# Altium footprint library PcbLib1.PcbLib: 10 footprints
Each footprint in its own frame and in the unit in brackets; x right, y up, seen from the top. Pads: shape width x height; smd on the part's side, far side on the other; paste and mask are expansions set on the pad; w line width, h text height; cw(c..) or ccw(c..) is an arc to the next point about the centre after c.
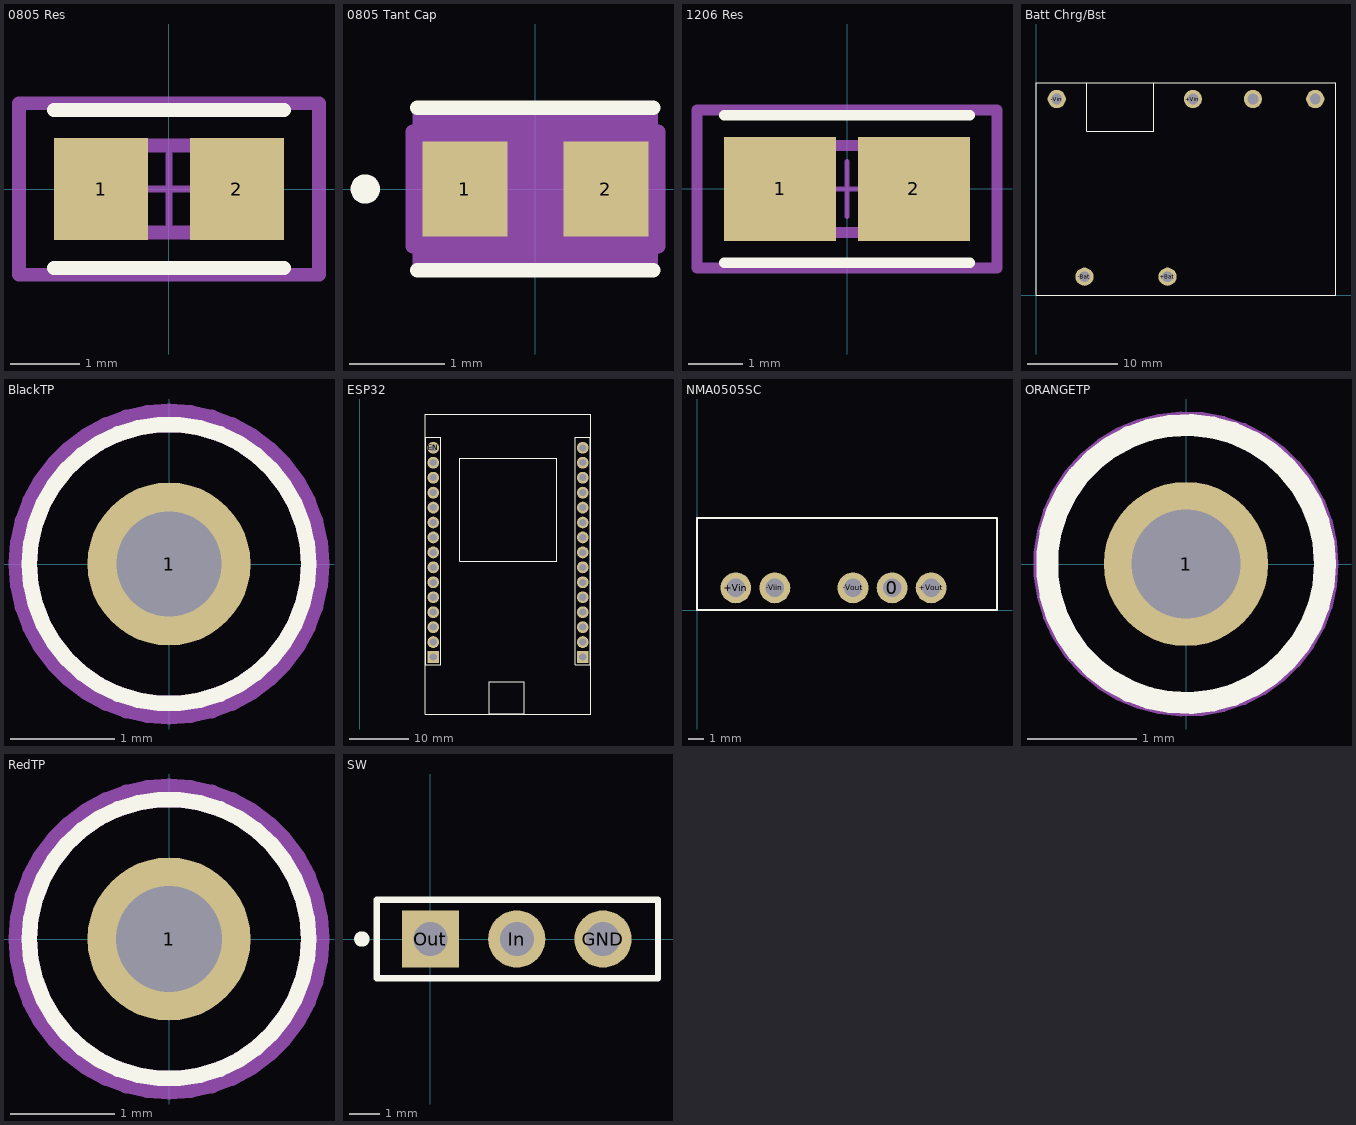
[diagram p0: the footprints below, top view; thin cyan lines are the x and y axes]

## 0805 Res [mil]
pads (2):
  rect 53.33x57.56 smd paste+0 mask+0: 1(-38.42,0) 2(38.42,0)
Top Overlay:
  lines w7.87: -65.08,-44.53 65.08,-44.53 ; -65.08,44.53 65.08,44.53
Top 3D Body:
  lines w7.87: -39.37,-24.61 39.37,-24.61 39.37,24.61 -39.37,24.61 -39.37,-24.61
Top Courtyard:
  lines w7.87: -84.77,-48.47 84.77,-48.47 84.77,48.47 -84.77,48.47 -84.77,-48.47
Top Assembly:
  lines w7.87: -84.77,-48.47 84.77,-48.47 84.77,48.47 -84.77,48.47 -84.77,-48.47
Top Component Center:
  lines w3.94: -19.68,0 19.68,0 ; 0,-19.68 0,19.68
3D body "Res_Stackpole_Electronics_RMCF0805JT220K_eec.STEP": height 10, standoff 0, extent -84.77,-48.47 84.77,48.47

## 0805 Tant Cap [mil]
pads (2):
  rect 34.98x39 smd paste+0 mask+0: 1(-29.01,0) 2(29.01,0)
Top Overlay:
  circle w6: c-70,0 r3
  lines w6: -48.5,-33.5 48.5,-33.5 ; -48.5,33.5 48.5,33.5
Mechanical 13:
  circle w0: c-33.5,0 r3
  lines w1: -43.5,-28.5 -43.5,28.5 43.5,28.5 43.5,-28.5 -43.5,-28.5
Mechanical 15:
  region: -47.5,-23.5 -50.5,-23.5 -50.5,23.5 -47.5,23.5 -47.5,32.5 47.5,32.5 47.5,23.5 50.5,23.5 50.5,-23.5 47.5,-23.5 47.5,-32.5 -47.5,-32.5
  lines w6: -50.5,-23.5 -47.5,-23.5 -47.5,-32.5 47.5,-32.5 47.5,-23.5 50.5,-23.5 50.5,23.5 47.5,23.5 47.5,32.5 -47.5,32.5 -47.5,23.5 -50.5,23.5 -50.5,-23.5
3D body "TCTP_ROM.step": height 49.02, standoff 0, extent -43.5,-28.5 43.5,28.5

## 1206 Res [mil]
pads (2):
  rect 80.9x75.05 smd paste+0 mask+0: 1(-48.25,0) 2(48.25,0)
Top Overlay:
  lines w7.87: -88.7,-53.27 88.7,-53.27 ; -88.7,53.27 88.7,53.27
Top 3D Body:
  lines w7.87: -62.99,-31.5 62.99,-31.5 62.99,31.5 -62.99,31.5 -62.99,-31.5
Top Courtyard:
  lines w7.87: -108.39,-57.21 108.39,-57.21 108.39,57.21 -108.39,57.21 -108.39,-57.21
Top Assembly:
  lines w7.87: -108.39,-57.21 108.39,-57.21 108.39,57.21 -108.39,57.21 -108.39,-57.21
  text ".Designator" at 0,7.39 h39.37
Top Component Center:
  lines w3.94: -19.68,0 19.68,0 ; 0,-19.68 0,19.68
3D body "Res_Panasonic_ERJ8CWFR010V_eec.STEP": height 10, standoff 0, extent -108.39,-57.21 108.39,57.21

## Batt Chrg/Bst [mil]
pads (6):
  round 79 hole 47 paste-99999 mask-99999: +Bat(570,80) +Vin(680,850) +Vout(1210,850) -Bat(210,80) -Vin(90,850) -Vout(940,850)
Top Overlay:
  lines w5: 220,920 220,710 510,710 510,920 ; 0,0 1300,0 1300,920 0,920 0,0
Top Solder:
  circle w42.5: c210,80 r21.25
  circle w42.5: c570,80 r21.25
  circle w42.5: c1210,850 r21.25
  circle w42.5: c940,850 r21.25
  circle w42.5: c680,850 r21.25
  circle w42.5: c90,850 r21.25
Bottom Solder:
  circle w42.5: c210,80 r21.25
  circle w42.5: c570,80 r21.25
  circle w42.5: c1210,850 r21.25
  circle w42.5: c940,850 r21.25
  circle w42.5: c680,850 r21.25
  circle w42.5: c90,850 r21.25
3D body: height 90, standoff 30, extent 220,710 510,920
3D body: height 30, standoff 0, extent 0,0 1300,920

## BlackTP [mm]
pads (1):
  round 1.57 hole 1.016 paste-2539.97 mask+0: 1(0,0)
Top Overlay:
  circle w0.15: c0,0 r1.345
Top 3D Body:
  circle w0.15: c0,0 r1.345
Top Courtyard:
  lines w0.2: -1.445,0 ccw(c0,0) 1.445,0 ccw(c0,0) -1.445,0
Top Assembly:
  text ".Designator" at 0,0.188 h1
Top Component Center:
  lines w0.1: -0.5,0 0.5,0 ; 0,-0.5 0,0.5
3D body "Conn_Keystone_5001_eec.STEP": height 0.25, standoff 0, extent -1.445,-1.445 1.445,1.445

## ESP32 [mil]
pads (30):
  rect 79x79 hole 47 square paste-99999 mask-99999: 3.3V(1492,580.13) Vin(492,580.13)
  round 79 hole 47 paste-99999 mask-99999: EN(492,1980.13) GND(492,680.13) GND(1492,680.13) GPIO2(1492,880.13) GPIO4(1492,980.13) GPIO5(1492,1280.13) GPIO12(492,880.13) GPIO13(492,780.13) GPIO14(492,980.13) GPIO15(1492,780.13) GPIO18(1492,1380.13) GPIO19(1492,1480.13) GPIO21(1492,1580.13) GPIO22(1492,1880.13) GPIO23(1492,1980.13) GPIO25(492,1280.13) GPIO26(492,1180.13) GPIO27(492,1080.13) GPIO32(492,1480.13) GPIO33(492,1380.13) GPIO34(492,1680.13) GPIO35(492,1580.13) GPIO36(492,1880.13) GPIO39(492,1780.13) RXD0(1492,1680.13) RXD2(1492,1080.13) TXD0(1492,1780.13) TXD2(1492,1180.13)
Top Overlay:
  lines w0: 442,530.13 442,2050.13 ; 442,530.13 542,530.13 ; 442,530.13 442,2050.13 ; 442,530.13 542,530.13 ; 442,530.13 542,530.13 ; 442,530.13 442,2050.13 ; 442,2050.13 542,2050.13 ; 442,2050.13 542,2050.13 ; 442,2050.13 542,2050.13 ; 542,530.13 542,2050.13 ; 542,530.13 542,2050.13 ; 542,530.13 542,2050.13 ; 1442,530.13 1442,2050.13 ; 1442,530.13 1542,530.13 ; 1442,530.13 1442,2050.13 ; 1442,530.13 1542,530.13 ; 1442,530.13 1542,530.13 ; 1442,530.13 1442,2050.13 ; 1442,2050.13 1542,2050.13 ; 1442,2050.13 1542,2050.13 ; 1442,2050.13 1542,2050.13 ; 1542,530.13 1542,2050.13 ; 1542,530.13 1542,2050.13 ; 1542,530.13 1542,2050.13
  lines w5: 440,199.1 440,213.9 440,2206 1544,2206 1544,199.1 440,199.1 ; 669.29,1220.47 669.29,1909.45 1318.9,1909.45 1318.9,1220.47 669.29,1220.47 ; 866.14,199.54 1102.36,199.54 1102.36,416.07 866.14,416.07 866.14,199.54
Top Solder:
  circle w42.5: c492,1980.13 r21.25
  circle w42.5: c492,1880.13 r21.25
  circle w42.5: c1492,1980.13 r21.25
  circle w42.5: c1492,1880.13 r21.25
  circle w42.5: c492,1780.13 r21.25
  circle w42.5: c492,1680.13 r21.25
  circle w42.5: c1492,1780.13 r21.25
  circle w42.5: c1492,1680.13 r21.25
  circle w42.5: c492,1580.13 r21.25
  circle w42.5: c1492,1580.13 r21.25
  circle w42.5: c492,1480.13 r21.25
  circle w42.5: c492,1380.13 r21.25
  circle w42.5: c1492,1480.13 r21.25
  circle w42.5: c1492,1380.13 r21.25
  circle w42.5: c492,1280.13 r21.25
  circle w42.5: c1492,1280.13 r21.25
  circle w42.5: c492,1180.13 r21.25
  circle w42.5: c492,1080.13 r21.25
  circle w42.5: c1492,1180.13 r21.25
  circle w42.5: c1492,1080.13 r21.25
  circle w42.5: c492,980.13 r21.25
  circle w42.5: c1492,980.13 r21.25
  circle w42.5: c492,880.13 r21.25
  circle w42.5: c492,780.13 r21.25
  circle w42.5: c1492,880.13 r21.25
  circle w42.5: c1492,780.13 r21.25
  circle w42.5: c492,680.13 r21.25
  region: 449.5,537.63 449.5,622.63 534.5,622.63 534.5,537.63
  circle w42.5: c1492,680.13 r21.25
  region: 1449.5,537.63 1449.5,622.63 1534.5,622.63 1534.5,537.63
Bottom Solder:
  circle w42.5: c492,1980.13 r21.25
  circle w42.5: c492,1880.13 r21.25
  circle w42.5: c1492,1980.13 r21.25
  circle w42.5: c1492,1880.13 r21.25
  circle w42.5: c492,1780.13 r21.25
  circle w42.5: c492,1680.13 r21.25
  circle w42.5: c1492,1780.13 r21.25
  circle w42.5: c1492,1680.13 r21.25
  circle w42.5: c492,1580.13 r21.25
  circle w42.5: c1492,1580.13 r21.25
  circle w42.5: c492,1480.13 r21.25
  circle w42.5: c492,1380.13 r21.25
  circle w42.5: c1492,1480.13 r21.25
  circle w42.5: c1492,1380.13 r21.25
  circle w42.5: c492,1280.13 r21.25
  circle w42.5: c1492,1280.13 r21.25
  circle w42.5: c492,1180.13 r21.25
  circle w42.5: c492,1080.13 r21.25
  circle w42.5: c1492,1180.13 r21.25
  circle w42.5: c1492,1080.13 r21.25
  circle w42.5: c492,980.13 r21.25
  circle w42.5: c1492,980.13 r21.25
  circle w42.5: c492,880.13 r21.25
  circle w42.5: c492,780.13 r21.25
  circle w42.5: c1492,880.13 r21.25
  circle w42.5: c1492,780.13 r21.25
  circle w42.5: c492,680.13 r21.25
  region: 449.5,537.63 449.5,622.63 534.5,622.63 534.5,537.63
  circle w42.5: c1492,680.13 r21.25
  region: 1449.5,537.63 1449.5,622.63 1534.5,622.63 1534.5,537.63
3D body: height 0, standoff -126, extent 1462,550.13 1522,610.13
3D body: height 0, standoff -126, extent 1462,650.13 1522,710.13
3D body: height 0, standoff -126, extent 1462,750.13 1522,810.13
3D body: height 0, standoff -126, extent 1462,850.13 1522,910.13
3D body: height 0, standoff -126, extent 1462,950.13 1522,1010.13
3D body: height 0, standoff -126, extent 1462,1050.13 1522,1110.13
3D body: height 0, standoff -126, extent 1462,1150.13 1522,1210.13
3D body: height 0, standoff -126, extent 1462,1250.13 1522,1310.13
3D body: height 0, standoff -126, extent 1462,1350.13 1522,1410.13
3D body: height 0, standoff -126, extent 1462,1450.13 1522,1510.13
3D body: height 0, standoff -126, extent 1462,1550.13 1522,1610.13
3D body: height 0, standoff -126, extent 1462,1650.13 1522,1710.13
3D body: height 0, standoff -126, extent 1462,1750.13 1522,1810.13
3D body: height 0, standoff -126, extent 1462,1850.13 1522,1910.13
3D body: height 0, standoff -126, extent 1462,1950.13 1522,2010.13
3D body: height 335, standoff 0, extent 1442,530.13 1542,2050.13
3D body: height 0, standoff -126, extent 462,550.13 522,610.13
3D body: height 0, standoff -126, extent 462,650.13 522,710.13
3D body: height 0, standoff -126, extent 462,750.13 522,810.13
3D body: height 0, standoff -126, extent 462,850.13 522,910.13
3D body: height 0, standoff -126, extent 462,950.13 522,1010.13
3D body: height 0, standoff -126, extent 462,1050.13 522,1110.13
3D body: height 0, standoff -126, extent 462,1150.13 522,1210.13
3D body: height 0, standoff -126, extent 462,1250.13 522,1310.13
3D body: height 0, standoff -126, extent 462,1350.13 522,1410.13
3D body: height 0, standoff -126, extent 462,1450.13 522,1510.13
3D body: height 0, standoff -126, extent 462,1550.13 522,1610.13
3D body: height 0, standoff -126, extent 462,1650.13 522,1710.13
3D body: height 0, standoff -126, extent 462,1750.13 522,1810.13
3D body: height 0, standoff -126, extent 462,1850.13 522,1910.13
3D body: height 0, standoff -126, extent 462,1950.13 522,2010.13
3D body: height 335, standoff 0, extent 442,530.13 542,2050.13
3D body "ESP32_DevKitV1.step": height 559.98, standoff 118.64, extent 440,199.1 1544.01,2205.97

## NMA0505SC [mil]
pads (5):
  round 79 hole 47 paste-99999 mask-99999: 0(499.21,57.09) +Vin(99.21,57.09) +Vout(599.21,57.09) -Viin(199.21,57.09) -Vout(399.21,57.09)
Top Overlay:
  lines w5: 0,0 767.72,0 767.72,236.22 0,236.22 0,0
Top Solder:
  circle w42.5: c99.21,57.09 r21.25
  circle w42.5: c199.21,57.09 r21.25
  circle w42.5: c399.21,57.09 r21.25
  circle w42.5: c499.21,57.09 r21.25
  circle w42.5: c599.21,57.09 r21.25
Bottom Solder:
  circle w42.5: c99.21,57.09 r21.25
  circle w42.5: c199.21,57.09 r21.25
  circle w42.5: c399.21,57.09 r21.25
  circle w42.5: c499.21,57.09 r21.25
  circle w42.5: c599.21,57.09 r21.25
3D body: height 393.7, standoff 0, extent 0,0 767.72,236.22

## ORANGETP [mm] "Test Point, Through Hole, Dia 2.54mm"
height 4.57
pads (1):
  round 1.5 hole 1: 1(0,0)
Top Overlay:
  circle w0.2: c0,0 r1.27
Mechanical 13:
  circle w0.1: c0,0 r1.27
Mechanical 15:
  circle w0.05: c0,0 r1.37
  lines w0.1: -0.5,0 0.5,0 ; 0,-0.5 0,0.5
3D body "User Library-Test Point Keystone - 5003 ORANGE.STEP": height 4.57, standoff -3.05, extent -1.27,-1.27 1.27,1.27

## RedTP [mm]
pads (1):
  round 1.57 hole 1.02 paste-2539.97 mask+0: 1(0,0)
Top Overlay:
  circle w0.15: c0,0 r1.345
Top 3D Body:
  circle w0.15: c0,0 r1.345
Top Courtyard:
  lines w0.2: -1.445,0 cw(c0,0) 1.445,0 cw(c0,0) -1.445,0
Top Assembly:
  text ".Designator" at 0,0.188 h1
Top Component Center:
  lines w0.1: -0.5,0 0.5,0 ; 0,-0.5 0,0.5
3D body "Conn_Keystone_5000_eec.STEP": height 0.25, standoff 0, extent -1.445,-1.445 1.445,1.445

## SW [mm]
pads (3):
  round 1.85 hole 1.1: GND(5.588,0) In(2.794,0)
  rect 1.85x1.85 hole 1.1: Out(0,0)
Top Overlay:
  circle w0.25: c-2.221,-0.001 r0.125
  lines w0.2: -1.74,-1.27 -1.74,1.27 7.366,1.27 7.366,-1.27 -1.74,-1.27